# Altium footprint library DiscreteSemiconductors.PcbLib: 111 footprints (part 4 of 7)
Each footprint in its own frame and in the unit in brackets; x right, y up, seen from the top. Pads: shape width x height; smd on the part's side, far side on the other; paste and mask are expansions set on the pad; w line width, h text height; cw(c..) or ccw(c..) is an arc to the next point about the centre after c.
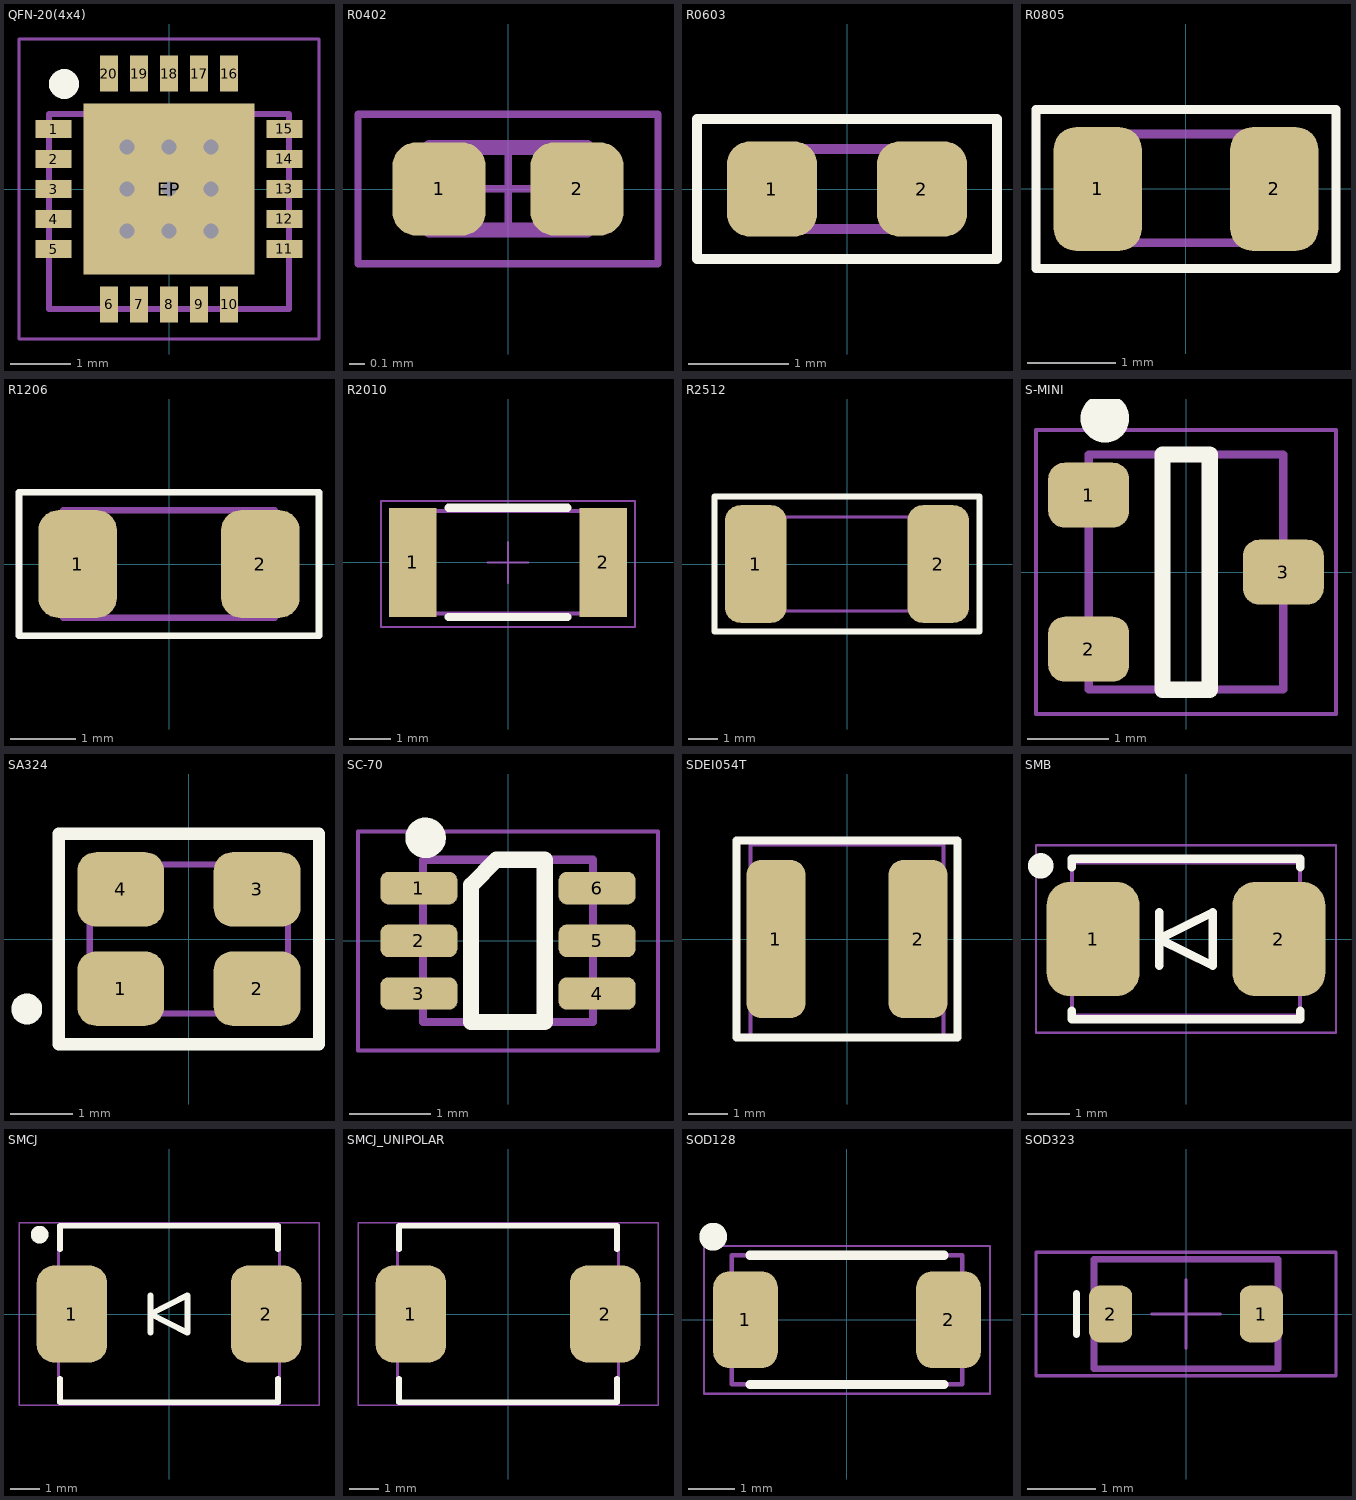
[diagram p3: the footprints below, top view; thin cyan lines are the x and y axes]

## QFN-20(4x4) [mm] "Plastic low profile quad flat package; 20Pin; 4X4mm"
height 0.8
pads (21):
  rect 0.6x0.3 smd: 1(-1.925,1) 2(-1.925,0.5) 3(-1.925,0) 4(-1.925,-0.5) 5(-1.925,-1) 11(1.925,-1) 12(1.925,-0.5) 13(1.925,0) 14(1.925,0.5) 15(1.925,1)
  rect 0.3x0.6 smd: 6(-1,-1.925) 7(-0.5,-1.925) 8(0,-1.925) 9(0.5,-1.925) 10(1,-1.925) 16(1,1.925) 17(0.5,1.925) 18(0,1.925) 19(-0.5,1.925) 20(-1,1.925)
  rect 2.85x2.85 smd: EP(0,0)
via 0.7,-0.7 diameter 0.5 hole 0.25
via 0,-0.7 diameter 0.5 hole 0.25
via -0.7,-0.7 diameter 0.5 hole 0.25
via -0.7,0.7 diameter 0.5 hole 0.25
via -0.7,0 diameter 0.5 hole 0.25
via 0.7,0 diameter 0.5 hole 0.25
via 0.7,0.7 diameter 0.5 hole 0.25
via 0,0.7 diameter 0.5 hole 0.25
via 0,0 diameter 0.5 hole 0.25
Top Overlay:
  circle w0.25: c-1.75,1.75 r0.125
Mechanical 13:
  lines w0.1: -2,-2 2,-2 2,1.25 -2,1.25 -2,-2
Mechanical 15:
  lines w0.05: -2.5,-2.5 2.5,-2.5 2.5,2.5 -2.5,2.5 -2.5,-2.5
3D body "User Library-qfn20-4x4.step": height 0.92, standoff 0, extent -2.019,-2.036 1.981,1.964

## R0402 [mm] "Chip Resistor, 2-Leads, Body 1.75x0.95mm"
height 0.55
pads (2):
  rrect50% 0.62x0.62 smd: 1(-0.46,0) 2(0.46,0)
Mechanical 13:
  lines w0.1: -0.525,-0.275 -0.525,0.275 0.525,0.275 0.525,-0.275 -0.525,-0.275
Mechanical 15:
  lines w0.05: -0.275,0 0.275,0 ; 0,-0.275 0,0.275 ; -1,-0.5 -1,0.5 1,0.5 1,-0.5 -1,-0.5
3D body "TE_CPF_Resistor_0402_001.step": height 0.3, standoff 0, extent -0.498,-0.254 0.502,0.246

## R0603 [mm] "Chip Resistor, 2-Leads, Body 1.75x0.95mm"
height 0.55
pads (2):
  rrect50% 0.9x0.95 smd: 1(-0.75,0) 2(0.75,0)
Top Overlay:
  lines w0.1: -1.5,-0.7 -1.5,0.7 1.5,0.7 1.5,-0.7 -1.5,-0.7
Mechanical 13:
  lines w0.1: -0.8,-0.4 0.8,-0.4 0.8,0.4 -0.8,0.4 -0.8,-0.4
Mechanical 15:
  lines w0.05: -1.5,-0.7 1.5,-0.7 1.5,0.7 -1.5,0.7 -1.5,-0.7
3D body "User Library-CR1608-0603.step": height 0.45, standoff 0, extent -0.8,-0.4 0.8,0.4

## R0805 [mm] "Chip Resistor, 2-Leads, Body 2.00x1.25mm, IPC Medium Density"
height 0.7
pads (2):
  rrect50% 1x1.4 smd: 1(-1,0) 2(1,0)
Top Overlay:
  lines w0.1: -1.7,-0.9 1.7,-0.9 1.7,0.9 -1.7,0.9 -1.7,-0.9
Mechanical 13:
  lines w0.1: -1,-0.61 1,-0.61 1,0.625 -1,0.625 -1,-0.61
Mechanical 15:
  lines w0.05: -1.7,-0.9 1.7,-0.9 1.7,0.9 -1.7,0.9 -1.7,-0.9
3D body "CRS0805.STEP": height 0.5, standoff 0, extent -1,-0.625 1,0.625

## R1206 [mm] "Chip Resistor, 2-Leads, Body 3.13x1.55mm, IPC Medium Density"
height 0.7
pads (2):
  rrect50% 1.2x1.65 smd: 1(-1.4,0) 2(1.4,0)
Top Overlay:
  lines w0.1: -2.3,-1.1 2.3,-1.1 2.3,0.8 2.3,1.1 -2.3,1.1 -2.3,0.8 -2.3,-1.1
Mechanical 13:
  lines w0.1: -1.625,-0.825 -1.625,0.825 1.625,0.825 1.625,-0.825 -1.625,-0.825
Mechanical 15:
  lines w0.05: -2.3,-1.1 -2.3,1.1 2.3,1.1 2.3,-1.1 -2.3,-1.1
3D body "User Library-CR3216-1206.STEP": height 0.6, standoff 0, extent -1.6,-0.8 1.6,0.8

## R2010 [mm] "2010  5.00mm x 2.50mm"
height 0.65
pads (2):
  rect 1.158x2.658 smd paste+0 mask+0: 1(-2.327,0) 2(2.327,0)
Top Overlay:
  lines w0.2: -1.448,-1.329 1.448,-1.329 ; -1.448,1.329 1.448,1.329
Mechanical 13:
  lines w0.1: -2.5,-1.25 2.5,-1.25 2.5,1.25 -2.5,1.25 -2.5,-1.25
Mechanical 15:
  lines w0.05: -0.5,0 0.5,0 ; 0,-0.5 0,0.5 ; -3.1,-1.579 3.1,-1.579 3.1,1.5 -3.1,1.5 -3.1,-1.579
3D body "Res_Yageo_RC2010JK-071KL_eec.STEP": height 0.65, standoff 0, extent -2.5,-1.25 2.5,1.25

## R2512 [mm] "0.254\" L x 0.132\" W (6.45mm x 3.35mm)"
height 0.9
pads (2):
  rrect50% 2.1x4 smd: 1(-3.1,0) 2(3.1,0)
Top Overlay:
  lines w0.2: -4.5,-2.3 -4.5,0.875 -4.5,2.3 4.5,2.3 4.5,-2.3 -4.5,-2.3
Mechanical 13:
  lines w0.1: -3.2,-1.6 -3.2,1.6 3.2,1.6 3.2,-1.6 -3.2,-1.6
Mechanical 15:
  lines w0.05: -4.5,-2.3 4.5,-2.3 4.5,2.3 -4.5,2.3 -4.5,-2.3
3D body "CircuitWorks-RESISTOR 2512.step": height 0.58, standoff -0.03, extent -3.175,-1.63 3.175,1.63

## S-MINI [mm] "S-MINI, 3-Leads, Body 2.9x2.5x1.1mm"
height 1.1
pads (3):
  rrect50% 1x0.8 smd: 1(-1.2,0.95) 2(-1.2,-0.95) 3(1.2,0)
Top Overlay:
  circle w0.5: c-1,1.9 r0.05
  lines w0.2: -0.29,-1.45 -0.29,1.45 0.294,1.45 0.294,-1.45 -0.29,-1.45
Mechanical 13:
  lines w0.1: -1.2,-1.45 -1.2,1.45 1.2,1.45 1.2,-1.45 -1.2,-1.45
Mechanical 15:
  lines w0.05: -1.85,-1.75 -1.85,1.75 1.85,1.75 1.85,-1.75 -1.85,-1.75
3D body "TLV431AFTA.stp": height 1, standoff 0, extent -1.2,-1.45 1.2,1.45

## SA324 [mm] "4-SMD, No Lead, 0.126\" L x 0.098\" W (3.20mm x 2.50mm)"
height 0.8
pads (4):
  rrect50% 1.4x1.2 smd: 1(-1.1,-0.8) 2(1.1,-0.8) 3(1.1,0.8) 4(-1.1,0.8)
Top Overlay:
  circle w0.25: c-2.616,-1.13 r0.125
  lines w0.2: -2.1,-1.7 2.1,-1.7 2.1,1.7 -2.1,1.7 -2.1,-1.7
Mechanical 13:
  lines w0.1: -1.6,-1.2 -1.6,1.2 1.6,1.2 1.6,-1.2 -1.6,-1.2
Mechanical 15:
  lines w0.05: -2.1,-1.7 2.1,-1.7 2.1,1.7 -2.1,1.7 -2.1,-1.7
3D body "User Library-Crystal_ECX-32.STEP": height 0.82, standoff 0, extent -1.6,-1.25 1.6,1.25

## SC-70 [mm] "6-Lead Thin Shrink Small Outline Transistor Package [SC70]  (KS-6)"
height 1
pads (6):
  rrect50% 0.95x0.4 smd mask+0.05: 1(-1.1,0.65) 2(-1.1,0) 3(-1.1,-0.65) 4(1.1,-0.65) 5(1.1,0) 6(1.1,0.65)
Top Overlay:
  circle w0.25: c-1.016,1.27 r0.125
  lines w0.2: -0.455,-1 0.454,-1 0.454,1 -0.143,1 -0.455,0.688 -0.455,-1
Mechanical 13:
  lines w0.1: -1.05,-1 1.05,-1 1.05,1 -1.05,1 -1.05,-1
Mechanical 15:
  lines w0.05: -1.85,-1.35 1.85,-1.35 1.85,1.35 -1.85,1.35 -1.85,-1.35
3D body "BC857CDW1T1G.stp": height 1.1, standoff 0, extent -1.05,-1 1.05,1

## SDEI054T [mm] "4.9mm x 4.9mm x 4.0mm inductor package"
height 4
pads (2):
  rrect50% 1.5x4 smd: 1(-1.8,0) 2(1.8,0)
Top Overlay:
  lines w0.2: -2.8,-2.5 2.8,-2.5 2.8,2.5 -2.8,2.5 -2.8,-2.5
Mechanical 13:
  lines w0.1: -2.45,-2.5 2.45,-2.5 2.45,2.392 -2.45,2.392 -2.45,-2.5
Mechanical 15:
  lines w0.05: -2.8,-2.5 -2.8,2.5 2.8,2.5 2.8,-2.5 -2.8,-2.5
3D body "User Library-CDRH4D28.step": height 3.01, standoff 0.1, extent -2.45,-2.508 2.45,2.392

## SMB [mm] "Surface Mount Package, Molded Plastic (DO-214AA)"
height 2
pads (2):
  rrect50% 2.2x2.7 smd: 1(-2.2,0) 2(2.2,0)
Top Overlay:
  circle w0.5: c-3.438,1.731 r0.05
  lines w0.2: -2.7,-1.7 -2.7,-1.9 2.7,-1.9 2.7,-1.7 ; -2.7,1.7 -2.7,1.9 2.7,1.9 2.7,1.7 ; -0.635,-0.635 -0.635,0.635 ; -0.635,0 0.635,-0.635 0.635,0.635 -0.635,0
Mechanical 13:
  lines w0.1: -2.7,-1.81 -2.7,1.81 2.7,1.81 2.7,-1.81 -2.7,-1.81
Mechanical 15:
  lines w0.05: -3.55,-2.22 -3.55,2.22 3.55,2.22 3.55,-2.22 -3.55,-2.22
3D body "SSB44-E3_52T.stp": height 2.44, standoff 0, extent -2.7,-1.81 2.7,1.81

## SMCJ [mm] "DO-214AB, SMC"
height 2.62
pads (2):
  rrect50% 2.4x3.3 smd: 1(-3.3,0) 2(3.3,0)
Top Overlay:
  circle w0.5: c-4.4,2.7 r0.05
  lines w0.2: -3.7,-2.2 -3.7,-3 3.7,-3 3.7,-2.2 ; -3.7,2.2 -3.7,3 3.7,3 3.7,2.2 ; -0.635,-0.635 -0.635,0.635 ; -0.635,0 0.635,0.635 0.635,-0.635 -0.635,0
Mechanical 13:
  lines w0.1: -3.751,-3 -3.751,3 3.751,3 3.751,-3 -3.751,-3
Mechanical 15:
  lines w0.05: -5.1,-3.1 5.1,-3.1 5.1,3.1 -5.1,3.1 -5.1,-3.1
3D body "User Library-SMCJ17A-13-F.step": height 2.31, standoff 0.05, extent -3.751,-2.98 3.751,2.98

## SMCJ_UNIPOLAR [mm] "DO-214AB, SMC"
height 2.62
pads (2):
  rrect50% 2.4x3.3 smd: 1(-3.3,0) 2(3.3,0)
Top Overlay:
  lines w0.2: -3.7,-2.2 -3.7,-3 3.7,-3 3.7,-2.2 ; -3.7,2.2 -3.7,3 3.7,3 3.7,2.2
Mechanical 13:
  lines w0.1: -3.751,-3 -3.751,3 3.751,3 3.751,-3 -3.751,-3
Mechanical 15:
  lines w0.05: -5.1,-3.1 5.1,-3.1 5.1,3.1 -5.1,3.1 -5.1,-3.1
3D body "User Library-SMCJ17A-13-F.step": height 2.31, standoff 0.05, extent -3.751,-2.98 3.751,2.98

## SOD128 [mm] "Plastic, surface mounted package; 2 terminals; 4 mm pitch;3.8 mm x 2.6 mm x 1 mm body"
height 1.1
pads (2):
  rrect50% 1.4x2.1 smd: 1(-2.2,0) 2(2.2,0)
Top Overlay:
  circle w0.5: c-2.9,1.8 r0.05
  lines w0.2: -2.1,-1.4 2.1,-1.4 ; -2.1,1.4 2.1,1.4
Mechanical 13:
  lines w0.1: -2.5,-1.4 2.5,-1.4 2.5,1.4 -2.5,1.4 -2.5,-1.4
Mechanical 15:
  lines w0.05: -3.1,-1.6 3.1,-1.6 3.1,1.6 -3.1,1.6 -3.1,-1.6
3D body "User Library-SOD128.step": height 1.1, standoff -0.01, extent -2.5,-1.35 2.5,1.35

## SOD323 [mm] "2.4x1.2mm"
height 0.8
pads (2):
  rrect50% 0.63x0.83 smd: 1(1.1,0) 2(-1.1,0)
Top Overlay:
  lines w0.1: -1.6,-0.3 -1.6,0.3
Mechanical 13:
  lines w0.1: -1.345,-0.8 1.345,-0.8 1.345,0.8 -1.345,0.8 -1.345,-0.8
Mechanical 15:
  lines w0.05: -0.5,0 0.5,0 ; 0,-0.5 0,0.5 ; -2.19,-0.9 2.19,-0.9 2.19,0.9 -2.19,0.9 -2.19,-0.9
3D body "User Library-SOD323.STEP": height 1, standoff 0.01, extent -1.25,-0.65 1.25,0.6